# Altium footprint library THT_CON.PcbLib: 48 footprints (part 1 of 3)
Each footprint in its own frame and in the unit in brackets; x right, y up, seen from the top. Pads: shape width x height; smd on the part's side, far side on the other; paste and mask are expansions set on the pad; w line width, h text height; cw(c..) or ccw(c..) is an arc to the next point about the centre after c.
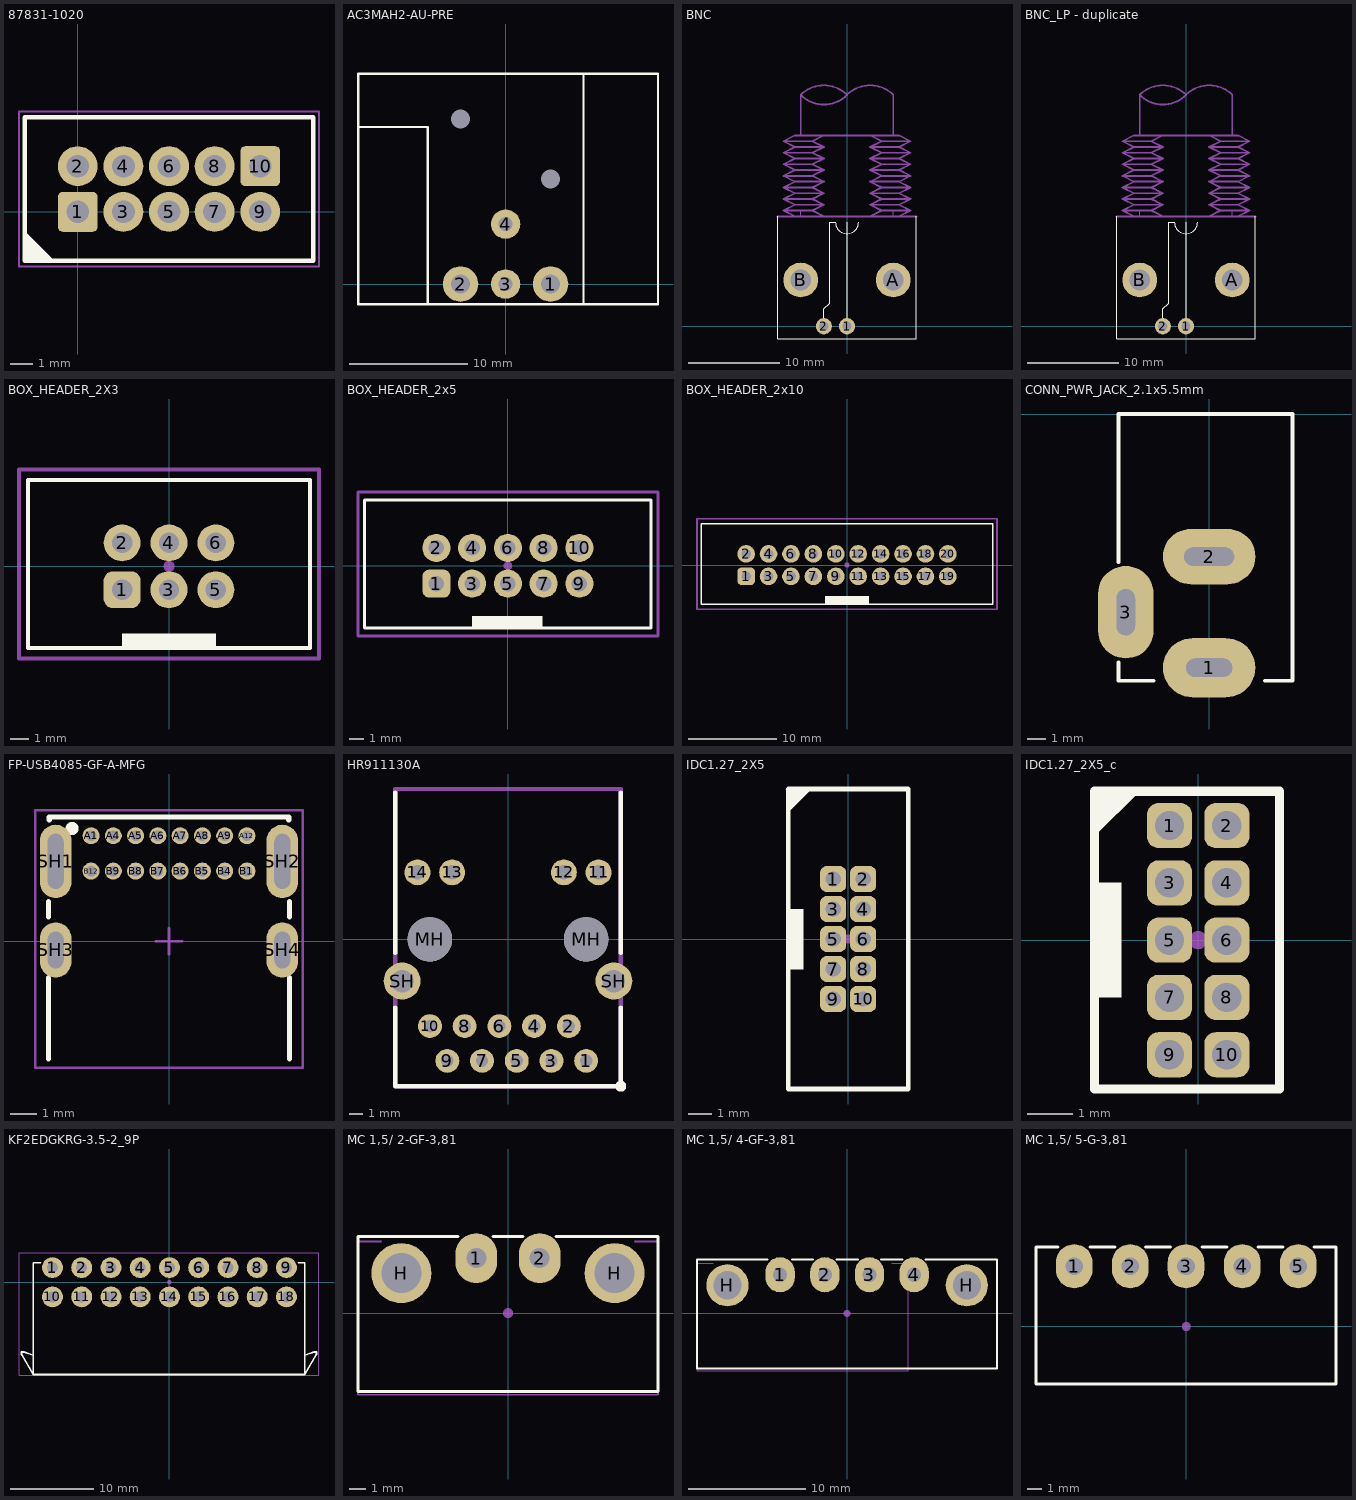
[diagram p0: the footprints below, top view; thin cyan lines are the x and y axes]

## 87831-1020 [mm]
pads (10):
  rrect25% 1.75x1.75 hole 1: 1(0,0) 10(8,2)
  round 1.75 hole 1: 2(0,2) 3(2,0) 4(2,2) 5(4,0) 6(4,2) 7(6,0) 8(6,2) 9(8,0)
Top Overlay:
  region: -2.325,-2.15 -2.325,-1.075 -2.238,-1.075 -1.162,-2.15
  lines w0.2: -2.3,-1 -1.149,-2.151 ; -2.325,-2.15 0,-2.15 10.325,-2.15 10.325,4.15 -2.325,4.15 -2.325,0 -2.325,-2.15
Mechanical 13:
  lines w0.1: -2.325,-2.15 -2.325,4.15 10.325,4.15 10.325,-2.15 -2.325,-2.15
Mechanical 15:
  lines w0.1: -2.575,-2.4 -2.575,4.4 10.575,4.4 10.575,-2.4 -2.575,-2.4
3D body "87831-1020.stp": height 6.27, standoff -2.63, extent -2.325,-2.1 10.325,4.2

## AC3MAH2-AU-PRE [mm]
pads (6):
  round 0 hole 1.6 unplated: 0(-3.81,13.97) 0(3.81,8.89)
  round 3 hole 1.6: 1(3.81,0) 2(-3.81,0)
  round 2.5 hole 1.2: 3(0,0) 4(0,5.08)
Top Overlay:
  lines w0.2: -12.5,13.3 -6.6,13.3 -6.6,-1.7 6.6,-1.7 6.6,17.8 ; -12.49,-1.7 12.91,-1.7 12.91,17.8 -12.49,17.8 -12.49,-1.7
3D body "AC3MAH-AU-PRE.x_t": height 25.4, standoff -3.58, extent -12.49,-1.7 12.909,20.5

## BNC [mil]
height 31.5
pads (4):
  round 70 hole 40: 1(0,0) 2(-100,0)
  round 150 hole 90: A(200,200) B(-200,200)
Top Overlay:
  lines w4: -300,475 -300,225 -300,-55.12 300,-55.12 300,475 300,-25 ; -100,0 -100,75 -75,100 -75,450 -50,450 ccw(c0,450) 50,450 ; 0,0 0,400 0,450 0,425
Mechanical 15:
  lines w4: -300,475 -100,475 ; -200,475 -200,500 ; -125,475 300,475 ; 200,475 200,500
  lines w8: -300,475 300,475 ; -225,475 -275,500 ; -200.17,999.83 ccw(c-100,1100) 0.17,999.83 ; -200.17,1000.17 cw(c-100,900) 0.17,1000.17 ; -200,825 -200,1000 ; -100,475 -150,500 ; -0.17,1000.17 cw(c100,900) 200.17,1000.17 ; 100,475 150,500 ; 200,825 200,1000 ; 225,475 275,500 ; -275,500 -225,525 ; -275,500 -150,500 ; -275,550 -225,525 ; -275,550 -225,575 ; -275,550 -150,550 ; -275,600 -225,575 ; -275,600 -225,625 ; -275,600 -150,600 ; -275,650 -225,625 ; -275,650 -225,675 ; -275,650 -150,650 ; -275,700 -225,675 ; -275,700 -225,725 ; -275,700 -150,700 ; -275,750 -225,725 ; -275,750 -225,775 ; -275,750 -150,750 ; -275,800 -225,775 ; -275,800 -225,825 ; -275,800 -150,800 ; -225,525 -100,525 ; -225,575 -100,575 ; -225,625 -100,625 ; -225,675 -100,675 ; -225,725 -100,725 ; -225,775 -100,775 ; -225,825 225,825 ; -225,825 -100,825 -150,800 ; -150,500 -100,525 ; -150,550 -100,525 ; -150,550 -100,575 ; -150,600 -100,575 ; -150,600 -100,625 ; -150,650 -100,625 ; -150,650 -100,675 ; -150,700 -100,675 ; -150,700 -100,725 ; -150,750 -100,725 ; -150,750 -100,775 ; -150,800 -100,775 ; 100,525 150,500 ; 100,525 150,550 ; 100,525 225,525 ; 100,575 150,550 ; 100,575 150,600 ; 100,575 225,575 ; 100,625 150,600 ; 100,625 150,650 ; 100,625 225,625 ; 100,675 150,650 ; 100,675 150,700 ; 100,675 225,675 ; 100,725 150,700 ; 100,725 150,750 ; 100,725 225,725 ; 100,775 150,750 ; 100,775 150,800 ; 100,775 225,775 ; 150,500 275,500 ; 150,550 275,550 ; 150,600 275,600 ; 150,650 275,650 ; 150,700 275,700 ; 150,750 275,750 ; 150,800 100,825 225,825 ; 150,800 275,800 ; 225,525 275,500 ; 225,525 275,550 ; 225,575 275,550 ; 225,575 275,600 ; 225,625 275,600 ; 225,625 275,650 ; 225,675 275,650 ; 225,675 275,700 ; 225,725 275,700 ; 225,725 275,750 ; 225,775 275,750 ; 225,775 275,800 ; 225,825 275,800
3D body "BNC_normal.STEP": height 622.05, standoff -165.35, extent -287.38,-75.57 289.39,1326

## BNC_LP - duplicate [mil]
height 31.5
pads (4):
  round 70 hole 40: 1(0,0) 2(-100,0)
  round 150 hole 90: A(200,200) B(-200,200)
Top Overlay:
  lines w4: -300,475 -300,225 -300,-55.12 300,-55.12 300,475 300,-25 ; -100,0 -100,75 -75,100 -75,450 -50,450 ccw(c0,450) 50,450 ; 0,0 0,400 0,450 0,425
Mechanical 15:
  lines w4: -300,475 -100,475 ; -200,475 -200,500 ; -125,475 300,475 ; 200,475 200,500
  lines w8: -300,475 300,475 ; -225,475 -275,500 ; -200.17,999.83 ccw(c-100,1100) 0.17,999.83 ; -200.17,1000.17 cw(c-100,900) 0.17,1000.17 ; -200,825 -200,1000 ; -100,475 -150,500 ; -0.17,1000.17 cw(c100,900) 200.17,1000.17 ; 100,475 150,500 ; 200,825 200,1000 ; 225,475 275,500 ; -275,500 -150,500 ; -275,500 -225,525 ; -275,550 -150,550 ; -275,550 -225,575 ; -275,550 -225,525 ; -275,600 -150,600 ; -275,600 -225,625 ; -275,600 -225,575 ; -275,650 -150,650 ; -275,650 -225,675 ; -275,650 -225,625 ; -275,700 -150,700 ; -275,700 -225,725 ; -275,700 -225,675 ; -275,750 -150,750 ; -275,750 -225,775 ; -275,750 -225,725 ; -275,800 -150,800 ; -275,800 -225,825 ; -275,800 -225,775 ; -225,525 -100,525 ; -225,575 -100,575 ; -225,625 -100,625 ; -225,675 -100,675 ; -225,725 -100,725 ; -225,775 -100,775 ; -225,825 -100,825 -150,800 ; -225,825 225,825 ; -150,500 -100,525 ; -150,550 -100,575 ; -150,550 -100,525 ; -150,600 -100,625 ; -150,600 -100,575 ; -150,650 -100,675 ; -150,650 -100,625 ; -150,700 -100,725 ; -150,700 -100,675 ; -150,750 -100,775 ; -150,750 -100,725 ; -150,800 -100,775 ; 100,525 225,525 ; 100,525 150,550 ; 100,525 150,500 ; 100,575 225,575 ; 100,575 150,600 ; 100,575 150,550 ; 100,625 225,625 ; 100,625 150,650 ; 100,625 150,600 ; 100,675 225,675 ; 100,675 150,700 ; 100,675 150,650 ; 100,725 225,725 ; 100,725 150,750 ; 100,725 150,700 ; 100,775 225,775 ; 100,775 150,800 ; 100,775 150,750 ; 150,500 275,500 ; 150,550 275,550 ; 150,600 275,600 ; 150,650 275,650 ; 150,700 275,700 ; 150,750 275,750 ; 150,800 275,800 ; 150,800 100,825 225,825 ; 225,525 275,550 ; 225,525 275,500 ; 225,575 275,600 ; 225,575 275,550 ; 225,625 275,650 ; 225,625 275,600 ; 225,675 275,700 ; 225,675 275,650 ; 225,725 275,750 ; 225,725 275,700 ; 225,775 275,800 ; 225,775 275,750 ; 225,825 275,800
3D body "User Library-BNC-144_GB-142_Default.sldprt": height 522.59, standoff -158.41, extent -289.5,-49 291.5,1326

## BOX_HEADER_2X3 [mm]
pads (6):
  rrect50% 2x2 / inner rrect50% 1.8x1.8 / far side rrect50% 2x2 hole 1.1: 1(-2.54,-1.27)
  round 2 / inner round 1.8 / far side round 2 hole 1.1: 2(-2.54,1.27) 3(0,-1.27) 4(0,1.27) 5(2.54,-1.27) 6(2.54,1.27)
Top Overlay:
  rectangle: -2.54,-4.425 2.54,-3.64
  lines w0.2: -7.64,-4.425 7.64,-4.425 ; -7.64,-4.425 -7.64,4.675 ; -7.64,-4.425 7.64,-4.425 ; -7.64,-4.425 -7.64,4.675 ; -7.64,4.675 7.64,4.675 ; -7.64,4.675 7.64,4.675 ; 7.64,-4.425 7.64,4.675 ; 7.64,-4.425 7.64,4.675
Mechanical 15:
  circle w0.4: c0,0 r0.098
  lines w0.2: -8.128,-5 -8.128,0.248 -8.128,5.25 8.128,5.25 8.128,-5 -8.128,-5
3D body "61200621621.stp": height 9.13, standoff -2.98, extent -7.64,-4.425 7.64,4.675

## BOX_HEADER_2x5 [mm]
pads (10):
  rrect50% 2x2 / inner rrect50% 1.8x1.8 / far side rrect50% 2x2 hole 1.1: 1(-5.08,-1.27)
  round 2 / inner round 1.8 / far side round 2 hole 1.1: 2(-5.08,1.27) 3(-2.54,-1.27) 4(-2.54,1.27) 5(0,-1.27) 6(0,1.27) 7(2.54,-1.27) 8(2.54,1.27) 9(5.08,-1.27) 10(5.08,1.27)
Top Overlay:
  rectangle: -2.54,-4.481 2.46,-3.556
  lines w0.2: -10.18,-4.425 10.16,-4.425 10.16,4.675 -10.18,4.675 -10.18,-4.425
Mechanical 15:
  circle w0.4: c0,0 r0.098
  lines w0.2: -10.65,-5 10.668,-5 10.668,5.25 -10.65,5.25 -10.65,1.5 -10.65,-5
3D body "61201021621.stp": height 9.13, standoff -2.98, extent -10.18,-4.425 10.18,4.675

## BOX_HEADER_2x10 [mm]
pads (20):
  rrect50% 2x2 / inner rrect50% 1.8x1.8 / far side rrect50% 2x2 hole 1.1: 1(-11.43,-1.27)
  round 2 / inner round 1.8 / far side round 2 hole 1.1: 2(-11.43,1.27) 3(-8.89,-1.27) 4(-8.89,1.27) 5(-6.35,-1.27) 6(-6.35,1.27) 7(-3.81,-1.27) 8(-3.81,1.27) 9(-1.27,-1.27) 10(-1.27,1.27) 11(1.27,-1.27) 12(1.27,1.27) 13(3.81,-1.27) 14(3.81,1.27) 15(6.35,-1.27) 16(6.35,1.27) 17(8.89,-1.27) 18(8.89,1.27) 19(11.43,-1.27) 20(11.43,1.27)
Top Overlay:
  rectangle: -2.5,-4.425 2.5,-3.5
  lines w0.2: -16.53,-4.425 16.53,-4.425 ; -16.53,-4.425 -16.53,4.675 ; -16.53,-4.425 16.53,-4.425 ; -16.53,-4.425 -16.53,4.675 ; -16.53,4.675 16.53,4.675 ; -16.53,4.675 16.53,4.675 ; 16.53,-4.425 16.53,4.675 ; 16.53,-4.425 16.53,4.675
Mechanical 15:
  circle w0.4: c0,0 r0.098
  lines w0.2: -17,-5 -17,1.5 -17,5.25 17,5.25 17,-5 -17,-5
3D body "61202021621.stp": height 9.13, standoff -2.98, extent -16.53,-4.425 16.53,4.675

## CONN_PWR_JACK_2.1x5.5mm [mm] "Power Connector, 2.1mm ID, 5.5mm OD"
height 11
pads (3):
  oval 5x3.2 hole 1 slot 2.5 at 0 deg: 1(0,-13.7)
  oval 5x3 hole 1 slot 2.7 at 0 deg: 2(0,-7.7)
  oval 3x5 hole 1 slot 2.5 at 90 deg: 3(-4.5,-10.7)
Top Overlay:
  lines w0.2: -4.9,-13.4 -4.9,-14.4 -3,-14.4 ; -4.9,-8 -4.9,0 4.5,0 4.5,-14.4 3,-14.4
3D body "User Library-PJ-002AH.STEP": height 11.05, standoff -3.45, extent -4.925,-14.4 4.475,0

## FP-USB4085-GF-A-MFG [mm]
pads (20):
  round 0.65 / inner round 0.65 / far side oval 0.7x1 hole 0.4 paste-2539.97 mask+0: A1(-2.975,4.025) A4(-2.125,4.025) A5(-1.275,4.025) A6(-0.425,4.025) A7(0.425,4.025) A8(1.275,4.025) A9(2.125,4.025) A12(2.975,4.025) B1(2.975,2.675) B4(2.125,2.675) B5(1.275,2.675) B6(0.425,2.675) B7(-0.425,2.675) B8(-1.275,2.675) B9(-2.125,2.675) B12(-2.975,2.675)
  rrect100% 1.2x2.8 hole 2.1 slot 0.6 at 0 deg paste-2539.97 mask+0: SH1(-4.325,3.045) SH2(4.325,3.045)
  rrect100% 1.2x2.1 hole 1.4 slot 0.6 at 0 deg paste-2539.97 mask+0: SH3(-4.325,-0.335) SH4(4.325,-0.335)
Top Overlay:
  circle w0.25: c-3.7,4.3 r0.125
  lines w0.2: -4.6,-4.5 -4.6,-1.4 ; -4.6,0.92 -4.6,1.5 ; -4.575,4.62 -4.575,4.735 4.575,4.735 4.575,4.62 ; 4.6,-4.5 4.6,-1.4 ; 4.6,0.92 4.6,1.5
Mechanical 15:
  lines w0.1: -0.5,0 0.5,0 ; 0,-0.5 0,0.5 ; -5.1,-4.835 5.1,-4.835 5.1,5 -5.1,5 -5.1,-4.835
3D body "Conn_GCT_USB4085-GF-A_eec.STEP": height 0.25, standoff 0, extent -4.875,-4.835 4.875,4.835

## HR911130A [mm]
pads (18):
  round 1.75 hole 0.9: 1(5.72,-8.89) 2(4.45,-6.35) 3(3.18,-8.89) 4(1.91,-6.35) 5(0.64,-8.89) 6(-0.63,-6.35) 7(-1.9,-8.89) 8(-3.17,-6.35) 9(-4.44,-8.89) 10(-5.71,-6.35)
  round 1.9 hole 1.05: 11(6.625,4.9) 12(4.085,4.9) 13(-4.085,4.9) 14(-6.625,4.9)
  round 3.25 hole 3.25 unplated: MH(-5.715,0) MH(5.715,0)
  round 2.7 hole 1.65: SH(-7.745,-3.05) SH(7.745,-3.05)
Top Overlay:
  circle w0.4: c8.25,-10.75 r0.2
  lines w0.3: -8.25,-5 -8.25,-10.75 8.25,-10.75 8.25,-5 ; -8.25,-1 -8.25,10.75 ; 8.25,-1 8.25,10.75
Mechanical 13:
  lines w0.3: -8.25,-10.75 8.25,-10.75 8.25,11 -8.25,11 -8.25,-10.75
  text "'.Designator'" at -5.665,-0.417 h1
  text "1" at 7.333,-9.5 h1
3D body "HR911130A.STEP": height 13.51, standoff -2.99, extent -7.94,-10.49 7.94,10.91

## IDC1.27_2X5 [mm]
pads (10):
  rrect50% 1.1x1.1 hole 0.65: 1(-0.635,2.54) 2(0.635,2.54) 3(-0.635,1.27) 4(0.635,1.27) 5(-0.635,0) 6(0.635,0) 7(-0.635,-1.27) 8(0.635,-1.27) 9(-0.635,-2.54) 10(0.635,-2.54)
Top Overlay:
  region: -1.6,6.3 -2.6,5.3 -2.6,6.31 -2.64,6.35
  region: -2.54,1.27 -1.905,1.27 -1.905,-1.27 -2.54,-1.27
  lines w0.2: -2.54,-6.35 2.54,-6.35 2.54,6.35 -2.54,6.35 -2.54,-6.35
Mechanical 15:
  circle w0.2: c0,0 r0.1
3D body "User Library-3220-10-0100.STEP": height 5.5, standoff -2, extent -2.58,-6.325 2.55,6.325

## IDC1.27_2X5_c [mm]
pads (10):
  rrect50% 1x1 hole 0.65: 1(-0.635,2.54) 2(0.635,2.54) 3(-0.635,1.27) 4(0.635,1.27) 5(-0.635,0) 6(0.635,0) 7(-0.635,-1.27) 8(0.635,-1.27) 9(-0.635,-2.54) 10(0.635,-2.54)
Top Overlay:
  region: -2.335,1.27 -1.7,1.27 -1.7,-1.27 -2.335,-1.27
  region: -1.3,3.3 -2.3,2.3 -2.3,3.31 -2.34,3.35
  lines w0.2: -2.3,-3.3 -2.3,3.3 1.8,3.3 1.8,-3.3 -2.3,-3.3
Mechanical 15:
  circle w0.2: c0,0 r0.1
3D body "PinHeader_2x05_P1.27mm_Vertical.step": height 4.1, standoff -2.2, extent -1.7,-3.175 1.7,3.175

## KF2EDGKRG-3.5-2_9P [mm] "phoenix 2x9p clone"
pads (18):
  round 2.5 hole 1.3: 1(-14,1.75) 2(-10.5,1.75) 3(-7,1.75) 4(-3.5,1.75) 5(0,1.75) 6(3.5,1.75) 7(7,1.75) 8(10.5,1.75) 9(14,1.75) 10(-14,-1.75) 11(-10.5,-1.75) 12(-7,-1.75) 13(-3.5,-1.75) 14(0,-1.75) 15(3.5,-1.75) 16(7,-1.75) 17(10.5,-1.75) 18(14,-1.75)
Top Overlay:
  lines w0.2: -16.3,-8.75 -17.4,-8.35 -17.7,-8.35 -17.7,-8.65 -16.3,-11.05 ; -15.4,2.35 -16.3,2.35 -16.3,-11.05 ; 15.4,2.35 16.2,2.35 16.2,-11.05 ; 16.2,-8.75 17.3,-8.35 17.6,-8.35 17.6,-8.65 16.2,-11.05 ; -16.3,-11.05 16.2,-11.05
Mechanical 15:
  circle w0.254: c0,0 r0.141
  lines w0.1: -18,-11.1 -18,3.5 17.9,3.5 17.9,-11.1 -17.5,-11.1 -18,-11.1
3D body "pxc_1953279_03_MCDN-1-5-9-G1-3-5-RNP14THR_3D.stp": height 15.28, standoff -1.32, extent -17.6,-11.05 17.6,2.35

## MC 1,5/ 2-GF-3,81 [mm]
height 12.7
pads (4):
  oval 2.5x3 hole 1.2: 1(-1.905,3.3) 2(1.905,3.3)
  round 3.6 / inner round 1.524 / far side round 3.6 hole 2.4: H(-6.405,2.4) H(6.405,2.4)
Top Overlay:
  lines w0.2: -3,4.6 -9,4.6 -9,-4.7 9,-4.7 9,4.6 2.9,4.6 ; -0.9,4.6 0.9,4.6
Mechanical 15:
  circle w0.4: c0,0 r0.1
Mechanical 22:
  lines w0.1: -7.62,4.3 -9.005,4.3 -9.005,-4.9 9.005,-4.9 9.005,4.3 7.62,4.3
3D body "2pin_SUPPLY.stp": height 7.25, standoff -3.4, extent -9.005,-4.677 9.005,4.623

## MC 1,5/ 4-GF-3,81 [mm]
height 12.7
pads (6):
  oval 2.5x3 hole 1.2: 1(-5.705,3.3) 2(-1.895,3.3) 3(1.915,3.3) 4(5.725,3.3)
  round 3.6 / inner round 1.524 / far side round 3.6 hole 2.4: H(-10.205,2.4) H(10.225,2.4)
Top Overlay:
  lines w0.2: -6.8,4.6 -12.8,4.6 -12.8,-4.7 12.8,-4.7 12.8,4.6 6.73,4.6 ; -4.7,4.6 -2.9,4.6 ; -0.89,4.6 0.91,4.6 ; 2.92,4.6 4.72,4.6
Mechanical 15:
  circle w0.4: c0,0 r0.1
Mechanical 22:
  lines w0.1: -11.42,4.3 -12.805,4.3 -12.805,-4.9 5.205,-4.9 5.205,4.3 3.82,4.3
3D body "pxc_1827884_08_MC-1-5-4-GF-3-81_3D.stp": height 7.25, standoff -3.4, extent -12.805,-4.677 12.825,4.623

## MC 1,5/ 5-G-3,81 [mm]
pads (5):
  oval 2.5x3 hole 1.2: 1(-7.62,4.1) 2(-3.81,4.1) 3(-0.02,4.1) 4(3.81,4.1) 5(7.62,4.1)
Top Overlay:
  lines w0.2: -8.72,5.4 -10.22,5.4 -10.22,-3.9 10.18,-3.9 10.18,-2.8 10.18,5.4 8.68,5.4 ; -6.55,5.4 -4.85,5.4 ; -2.76,5.4 -1.06,5.4 ; 1.07,5.4 2.77,5.4 ; 4.88,5.4 6.58,5.4
Mechanical 15:
  circle w0.4: c0,0 r0.1
3D body "1803303.stp": height 7.25, standoff -3.4, extent -10.24,-3.9 10.2,5.4